# Altium footprint library SMT.PcbLib: 379 footprints (part 3 of 24)
Each footprint in its own frame and in the unit in brackets; x right, y up, seen from the top. Pads: shape width x height; smd on the part's side, far side on the other; paste and mask are expansions set on the pad; w line width, h text height; cw(c..) or ccw(c..) is an arc to the next point about the centre after c.
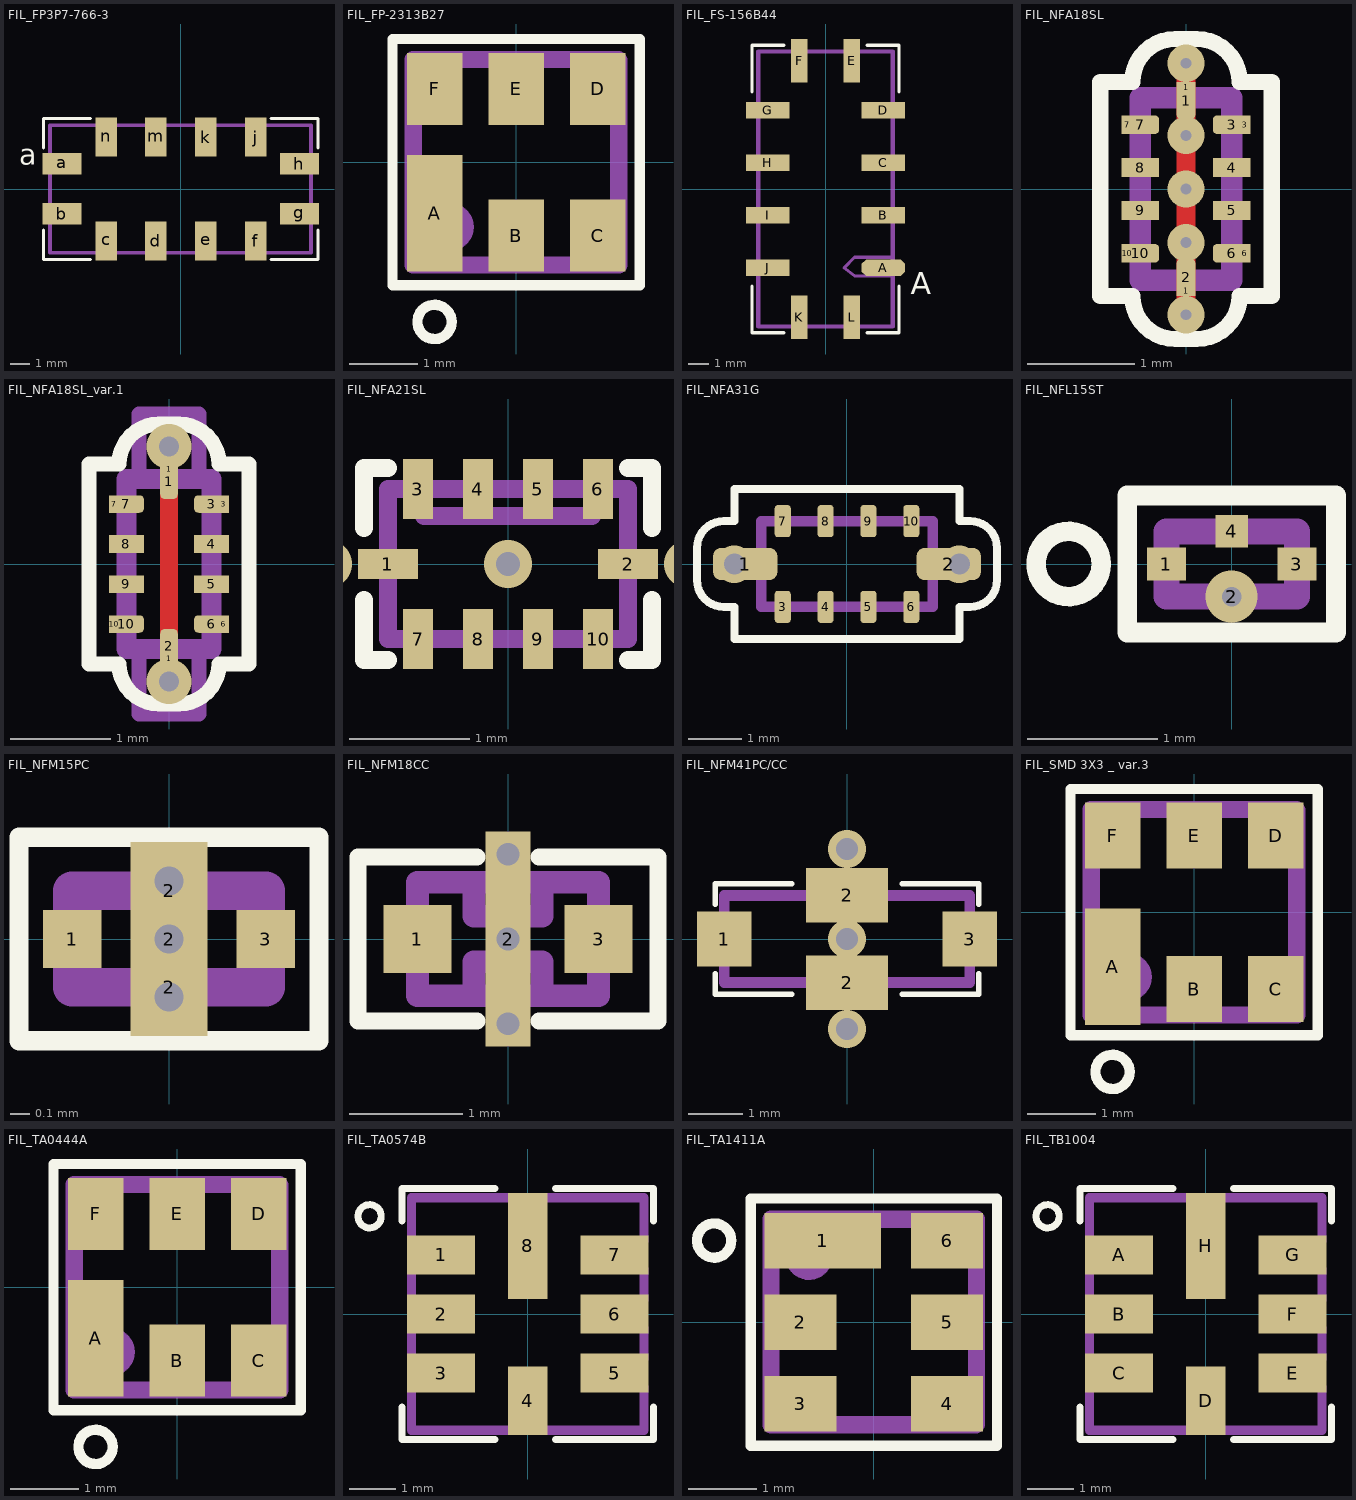
[diagram p2: the footprints below, top view; thin cyan lines are the x and y axes]

## FIL_FP3P7-766-3 [mm] "Фильтр пьезозлектрическии 13,3X6.5X2"
height 2
pads (12):
  rect 2x1.1 smd: a(-6.06,1.28) b(-6.06,-1.26) g(6.04,-1.26) h(6.04,1.28)
  rect 1.1x2 smd: c(-3.81,-2.65) d(-1.27,-2.65) e(1.27,-2.65) f(3.81,-2.65) j(3.81,2.65) k(1.27,2.65) m(-1.27,2.65) n(-3.81,2.65)
Top Overlay:
  lines w0.15: -7,-2.1 -7,-3.6 -4.6,-3.6 ; -7,2.1 -7,3.6 -4.6,3.6 ; 4.6,-3.6 7,-3.6 7,-2.1 ; 4.6,3.6 7,3.6 7,2.1
  text "a" at -8.25,0.87 h1.8
Mechanical 1:
  circle w0.2: c-5.625,1.27 r0.25
  lines w0.2: -6.66,-3.25 -6.66,-1.67 ccw(c-6.66,-1.27) -6.66,-0.87 -6.66,0.87 ccw(c-6.66,1.27) -6.66,1.67 -6.66,3.25 -4.22,3.25 ccw(c-3.82,3.25) -3.42,3.25 -1.68,3.25 ccw(c-1.28,3.25) -0.88,3.25 0.86,3.25 ccw(c1.26,3.25) 1.66,3.25 3.4,3.25 ccw(c3.8,3.25) 4.2,3.25 6.64,3.25 6.64,1.67 ccw(c6.64,1.27) 6.64,0.87 6.64,-0.87 ccw(c6.64,-1.27) 6.64,-1.67 6.64,-3.25 4.2,-3.25 ccw(c3.8,-3.25) 3.4,-3.25 1.66,-3.25 ccw(c1.26,-3.25) 0.86,-3.25 -0.88,-3.25 ccw(c-1.28,-3.25) -1.68,-3.25 -3.42,-3.25 ccw(c-3.82,-3.25) -4.22,-3.25 -6.66,-3.25
3D body "ФП3П7-766-3-01.stp": height 2.01, standoff 0.01, extent -6.65,-3.25 6.65,3.25

## FIL_FP-2313B27 [mm] "SMD 3,0x3,0"
height 1.4
pads (6):
  rect 0.81x1.7 smd: A(-1.19,-0.745)
  rect 0.81x1.05 smd: B(0,-1.07) C(1.19,-1.07) D(1.19,1.07) E(0,1.07) F(-1.19,1.07)
Top Overlay:
  circle w0.15: c-1.19,-2.33 r0.25
  lines w0.15: -1.805,-1.795 -1.805,1.8 1.805,1.8 1.805,-1.795 -1.805,-1.795
Mechanical 1:
  circle w0.2: c-0.965,-0.945 r0.25
  lines w0.254: -1.5,-1.5 -1.5,1.5 1.49,1.5 1.5,1.49 1.5,-1.5 -1.5,-1.5
3D body "SMD_3,0Х3,0.STEP": height 1.37, standoff 0, extent -1.495,-1.5 1.505,1.5

## FIL_FS-156B44 [mm] "Бутис_FS-156B44"
height 1.8
pads (12):
  oct 2.1x0.8 smd: A(2.8,-3.81)
  rect 2.1x0.8 smd: B(2.8,-1.27) C(2.8,1.27) D(2.8,3.81) G(-2.8,3.81) H(-2.8,1.27) I(-2.8,-1.27) J(-2.8,-3.81)
  rect 0.8x2.1 smd: E(1.27,6.2) F(-1.27,6.2) K(-1.27,-6.2) L(1.27,-6.2)
Top Overlay:
  lines w0.15: -3.55,-4.7 -3.55,-6.95 -2,-6.95 ; -3.55,4.7 -3.55,6.95 -2,6.95 ; 2,-6.95 3.55,-6.95 3.55,-4.7 ; 2,6.95 3.55,6.95 3.55,4.7
  text "A" at 4.125,-5.45 h1.8
Mechanical 1:
  lines w0.15: 3.25,-4.2 1.4,-4.2 0.9,-3.81 1.4,-3.3 3.25,-3.3
  lines w0.2: -3.25,-6.65 3.25,-6.65 3.25,6.65 -3.25,6.65 -3.25,-6.65
3D body "FS-156B44.stp": height 1.8, standoff 0, extent -3.25,-6.65 3.25,6.65

## FIL_NFA18SL [mm] "Chip Array, Flat, 8-Leads, Pitch 0,40mm,  Body 1,60x0,80mm,  IPC Medium Density"
height 0.65
pads (16):
  rect 0.175x0.1 smd mask+0.05: 1(0,-0.95) 1(0,0.95)
  rrect50% 0.175x0.35 smd mask+0.05: 1(0,0.825) 2(0,-0.825)
  rrect50% 0.35x0.175 smd paste+0.015 mask+0.05: 3(0.425,0.6) 6(0.425,-0.6) 7(-0.425,0.6) 10(-0.425,-0.6)
  rect 0.1x0.175 smd paste+0.015 mask+0.05: 3(0.55,0.6) 6(0.55,-0.6) 7(-0.55,0.6) 10(-0.55,-0.6)
  rect 0.35x0.175 smd paste+0.015 mask+0.05: 4(0.425,0.2) 5(0.425,-0.2) 8(-0.425,0.2) 9(-0.425,-0.2)
via 0,-0.5 diameter 0.35 hole 0.1
via 0,0.5 diameter 0.35 hole 0.1
via 0,0 diameter 0.35 hole 0.1
via 0,1.175 diameter 0.35 hole 0.1
via 0,-1.175 diameter 0.35 hole 0.1
Top Layer:
  lines w0.175: 0,-1.175 0,-0.825 0,0.825 ; 0,1.175 0,0.85 ; 0,0.85 0,0.85
Top Overlay:
  lines w0.15: -0.8,-1 -0.8,1 -0.5,1 cw(c-0.1,1) -0.1,1.4 0.1,1.4 cw(c0.1,1) 0.5,1 0.8,1 0.8,-1 0.5,-1 cw(c0.1,-1) 0.1,-1.4 -0.1,-1.4 cw(c-0.1,-1) -0.5,-1 -0.8,-1
Mechanical 1:
  lines w0.2: -0.425,-0.85 0.425,-0.85 0.425,0.85 -0.425,0.85 -0.425,-0.85
Mechanical 20:
  text "Отв. 0,1  / заполнить" at -1.725,1.475 h1
3D body "CAF-40P159X79-8N.step": height 0.65, standoff 0, extent -0.5,-0.85 0.5,0.85

## FIL_NFA18SL_var.1 [mm] "Chip Array, Flat, 8-Leads, Pitch 0,40mm,  Body 1,60x0,80mm,  установка не по datasheet"
height 0.65
pads (16):
  rect 0.175x0.1 smd mask+0.05: 1(0,-0.95) 1(0,0.95)
  rrect50% 0.175x0.35 smd mask+0.05: 1(0,0.825) 2(0,-0.825)
  rrect50% 0.35x0.175 smd paste+0.015 mask+0.05: 3(0.425,0.6) 6(0.425,-0.6) 7(-0.425,0.6) 10(-0.425,-0.6)
  rect 0.1x0.175 smd paste+0.015 mask+0.05: 3(0.55,0.6) 6(0.55,-0.6) 7(-0.55,0.6) 10(-0.55,-0.6)
  rect 0.35x0.175 smd paste+0.015 mask+0.05: 4(0.425,0.2) 5(0.425,-0.2) 8(-0.425,0.2) 9(-0.425,-0.2)
via 0,-1.175 diameter 0.45 hole 0.2
via 0,1.175 diameter 0.45 hole 0.2
Top Layer:
  lines w0.175: 0,-1.175 0,-0.825 0,0.825 ; 0,1.175 0,0.85 ; 0,0.85 0,0.85
Top Overlay:
  lines w0.15: -0.8,-1 -0.8,1 -0.5,1 cw(c-0.1,1) -0.1,1.4 0.1,1.4 cw(c0.1,1) 0.5,1 0.8,1 0.8,-1 0.5,-1 cw(c0.1,-1) 0.1,-1.4 -0.1,-1.4 cw(c-0.1,-1) -0.5,-1 -0.8,-1
Mechanical 1:
  lines w0.2: -0.425,-0.85 0.425,-0.85 0.425,0.85 -0.425,0.85 -0.425,-0.85
Mechanical 5:
  lines w0.15: -0.3,-1.5 0.3,-1.5 0.3,-0.85 -0.3,-0.85 -0.3,-1.5 ; -0.3,0.85 -0.3,1.5 0.3,1.5 0.3,0.85 -0.3,0.85
Mechanical 20:
  text "Отв. 0,2  / заполнить" at -1.725,1.475 h1
3D body "CAF-40P159X79-8N.step": height 0.65, standoff 0, extent -0.5,-0.85 0.5,0.85

## FIL_NFA21SL [mm] "Chip filter,  2-Leads, Body 2.0x1.25mm, IPC Medium Density"
height 0.5
pads (10):
  rect 0.5x0.25 smd mask+0.05: 1(-1,0) 2(1,0)
  rect 0.25x0.5 smd mask+0.05: 3(-0.75,0.625) 4(-0.25,0.625) 5(0.25,0.625) 6(0.75,0.625) 7(-0.75,-0.625) 8(-0.25,-0.625) 9(0.25,-0.625) 10(0.75,-0.625)
via 0,0 diameter 0.4 hole 0.2
via 1.5,0 diameter 0.4 hole 0.2
via -1.5,0 diameter 0.4 hole 0.2
Top Overlay:
  lines w0.15: -1.2,-0.3 -1.2,-0.8 -1,-0.8 ; -1.2,0.3 -1.2,0.8 -1,0.8 ; 1,-0.8 1.2,-0.8 1.2,-0.3 ; 1,0.8 1.2,0.8 1.2,0.3
Mechanical 1:
  lines w0.15: -0.7,0.4 0.7,0.4 ; -1,-0.625 1,-0.625 1,0.625 -1,0.625 -1,-0.625
3D body "NFA21.stp": height 0.51, standoff -0.01, extent -1,-0.625 1,0.625

## FIL_NFA31G [mm] "SMT filter NFA31G Series (1206 Size)"
height 1
pads (10):
  rrect50% 1.2x0.6 smd paste-10 mask+0.05: 1(-1.9,0) 2(1.9,0)
  rrect40% 0.3x0.6 smd paste+0 mask+0.05: 3(-1.2,-0.8) 4(-0.4,-0.8) 5(0.4,-0.8) 6(1.2,-0.8) 7(-1.2,0.8) 8(-0.4,0.8) 9(0.4,0.8) 10(1.2,0.8)
via 2.1,0 diameter 0.7 hole 0.4
via -2.1,0 diameter 0.7 hole 0.4
Top Overlay:
  lines w0.15: -2.8,-0.3 ccw(c-2.3,-0.3) -2.3,-0.8 -2.1,-0.8 -2.1,-1.4 2.1,-1.4 2.1,-0.8 2.3,-0.8 ccw(c2.3,-0.3) 2.8,-0.3 2.8,0.3 ccw(c2.3,0.3) 2.3,0.8 2.1,0.8 2.1,1.4 -2.1,1.4 -2.1,0.8 -2.3,0.8 ccw(c-2.3,0.3) -2.8,0.3 -2.8,-0.3
Top Paste:
  region: 1.45,0.3 1.42,0.3 1.365,0.277 1.323,0.235 1.3,0.18 1.3,0.15 1.3,-0.15 1.3,-0.18 1.323,-0.235 1.365,-0.277 1.42,-0.3 1.45,-0.3 1.75,-0.3 1.78,-0.3 1.835,-0.277 1.877,-0.235 1.9,-0.18 1.9,-0.15 1.9,0.15 1.9,0.18 1.877,0.235 1.835,0.277 1.78,0.3 1.75,0.3
  region: -1.45,0.3 -1.42,0.3 -1.365,0.277 -1.323,0.235 -1.3,0.18 -1.3,0.15 -1.3,-0.15 -1.3,-0.18 -1.323,-0.235 -1.365,-0.277 -1.42,-0.3 -1.45,-0.3 -1.75,-0.3 -1.78,-0.3 -1.835,-0.277 -1.877,-0.235 -1.9,-0.18 -1.9,-0.15 -1.9,0.15 -1.9,0.18 -1.877,0.235 -1.835,0.277 -1.78,0.3 -1.75,0.3
Top Solder:
  region: 1.85,0.35 1.86,0.35 1.878,0.342 1.892,0.328 1.9,0.31 1.9,0.3 1.9,-0.3 1.9,-0.31 1.892,-0.328 1.878,-0.342 1.86,-0.35 1.85,-0.35 1.3,-0.35 1.29,-0.35 1.272,-0.342 1.258,-0.328 1.25,-0.31 1.25,-0.3 1.25,0.3 1.25,0.31 1.258,0.328 1.272,0.342 1.29,0.35 1.3,0.35
  region: -1.85,0.35 -1.86,0.35 -1.878,0.342 -1.892,0.328 -1.9,0.31 -1.9,0.3 -1.9,-0.3 -1.9,-0.31 -1.892,-0.328 -1.878,-0.342 -1.86,-0.35 -1.85,-0.35 -1.3,-0.35 -1.29,-0.35 -1.272,-0.342 -1.258,-0.328 -1.25,-0.31 -1.25,-0.3 -1.25,0.3 -1.25,0.31 -1.258,0.328 -1.272,0.342 -1.29,0.35 -1.3,0.35
Mechanical 1:
  lines w0.2: -1.7,0 -1.6,0 ; -1.2,-0.9 -1.2,-0.8 ; -1.2,0.8 -1.2,0.9 ; -0.4,-0.9 -0.4,-0.8 ; -0.4,0.8 -0.4,0.9 ; 0.4,-0.9 0.4,-0.8 ; 0.4,0.8 0.4,0.9 ; 1.2,-0.9 1.2,-0.8 ; 1.2,0.8 1.2,0.9 ; 1.6,0 1.7,0 ; -1.6,-0.8 -1.6,0.8 1.6,0.8 1.6,-0.8 -1.6,-0.8
3D body "User Library-EMIFIL.STEP": height 0.81, standoff 0.01, extent -1.6,-0.8 1.6,0.8

## FIL_NFL15ST [mm] "Chip Filter, 4-Leads, Body 1,00x0,50mm, IPC Medium Density"
height 0.35
pads (4):
  rect 0.3x0.25 smd paste+0 mask+0.05: 1(-0.5,0) 3(0.5,0)
  rect 0.25x0.25 smd paste+0 mask+0.05: 2(0,-0.25) 4(0,0.25)
via 0,-0.25 diameter 0.4 hole 0.15
Top Overlay:
  circle w0.15: c-1.25,0 r0.25
  lines w0.15: -0.8,-0.525 0.8,-0.525 0.8,0.525 -0.8,0.525 -0.8,-0.525
Mechanical 1:
  lines w0.2: -0.5,-0.25 0.5,-0.25 0.5,0.25 -0.5,0.25 -0.5,-0.25
Mechanical 20:
  text "Отверстия  / заполнить" at -3.35,0.7 h1.5
3D body "FIL_NFL15ST.step": height 0.35, standoff 0, extent -0.5,-0.25 0.5,0.25

## FIL_NFM15PC [mm] "Chip Capacitor, 2-Leads, Body 1,00x0,50mm, IPC Medium Density"
height 0.5
pads (5):
  rect 0.3x0.3 smd paste+0 mask+0.05: 1(-0.5,0) 3(0.5,0)
  rect 0.25x0.25 smd paste+0 mask+0.05: 2(0,-0.25) 2(0,0.25)
  rect 0.4x1 smd paste-10: 2(0,0)
via 0,0 diameter 0.4 hole 0.15
via 0,-0.3 diameter 0.4 hole 0.15
via 0,0.3 diameter 0.4 hole 0.15
Top Overlay:
  lines w0.1: -0.775,-0.525 -0.775,0.525 0.775,0.525 0.775,-0.525 -0.775,-0.525
Mechanical 1:
  lines w0.2: -0.5,-0.25 -0.5,0.25 0.5,0.25 0.5,-0.25 -0.5,-0.25
Mechanical 20:
  text "Отверстия  / заполнить" at -3.3,0.925 h1.5
3D body "CAPC1005X05N.step": height 0.5, standoff 0, extent -0.55,-0.35 0.55,0.35

## FIL_NFM18CC [mm] "0603 size general 3-terminal capacitor."
height 0.6
pads (3):
  rect 0.6x0.6 smd paste+0 mask+0.1: 1(-0.8,0) 3(0.8,0)
  rect 0.4x1.9 smd paste-20: 2(0,0)
via 0,0 diameter 0.4 hole 0.2
via 0,0.75 diameter 0.4 hole 0.2
via 0,-0.75 diameter 0.4 hole 0.2
Top Overlay:
  lines w0.15: -0.275,-0.725 -1.325,-0.725 -1.325,0.725 -0.275,0.725 ; 0.275,-0.725 1.325,-0.725 1.325,0.725 0.275,0.725
Top Paste:
  rectangle: -0.2,-0.6 0.2,-0.2
  rectangle: -0.2,0.2 0.2,0.6
Top Solder:
  rectangle: -0.25,-0.6 0.25,-0.2
  rectangle: -0.25,0.2 0.25,0.6
Mechanical 1:
  lines w0.2: -0.3,-0.5 -0.3,-0.2 0.3,-0.2 0.3,-0.5 ; -0.3,0.5 -0.3,0.2 0.3,0.2 0.3,0.5 ; -0.8,-0.5 -0.8,0.5 0.8,0.5 0.8,-0.5 -0.8,-0.5
3D body "User Library-EMIFIL_0603.STEP": height 0.6, standoff 0, extent -0.8,-0.409 0.8,0.409

## FIL_NFM41PC/CC [mm] "Chip filter,  2-Leads, Body 4.5x1.6mm, IPC Medium Density"
height 1
pads (4):
  rect 1x1 smd paste+0 mask+0.05: 1(-2.25,0) 3(2.25,0)
  rect 1.5x1 smd paste+0 mask+0.05: 2(0,-0.8) 2(0,0.8)
via 0,0 diameter 0.7 hole 0.4
via 0,1.651 diameter 0.7 hole 0.4
via 0,-1.651 diameter 0.7 hole 0.4
Top Overlay:
  lines w0.1: -2.413,-0.635 -2.413,-1.016 -1.016,-1.016 ; -2.413,0.635 -2.413,1.016 -1.016,1.016 ; 1.016,-1.016 2.413,-1.016 2.413,-0.635 ; 1.016,1.016 2.413,1.016 2.413,0.635
Mechanical 1:
  lines w0.2: -2.25,-0.8 -2.25,0.8 2.25,0.8 2.25,-0.8 -2.25,-0.8
3D body "NFM41PC.stp": height 1.01, standoff -0.01, extent -2.25,-0.8 2.25,0.8

## FIL_SMD 3X3 _ var.3 [mm] "SMD 3,0x3,0"
height 1.4
pads (6):
  rect 0.81x1.7 smd: A(-1.19,-0.795)
  rect 0.81x0.96 smd: B(0,-1.12) C(1.19,-1.12) D(1.19,1.12) E(0,1.12) F(-1.19,1.12)
Top Overlay:
  circle w0.15: c-1.19,-2.33 r0.25
  lines w0.15: -1.805,-1.795 -1.805,1.8 1.805,1.8 1.805,-1.795 -1.805,-1.795
Mechanical 1:
  circle w0.2: c-0.965,-0.945 r0.25
  lines w0.254: -1.5,-1.5 -1.5,1.5 1.49,1.5 1.5,1.49 1.5,-1.5 -1.5,-1.5
3D body "SMD_3,0Х3,0.STEP": height 1.37, standoff 0, extent -1.495,-1.5 1.505,1.5

## FIL_TA0444A [mm] "SMD 3,0x3,0"
height 1.4
pads (6):
  rect 0.81x1.7 smd: A(-1.19,-0.745)
  rect 0.81x1.05 smd: B(0,-1.07) C(1.19,-1.07) D(1.19,1.07) E(0,1.07) F(-1.19,1.07)
Top Overlay:
  circle w0.15: c-1.19,-2.33 r0.25
  lines w0.15: -1.805,-1.795 1.805,-1.795 1.805,1.8 -1.805,1.8 -1.805,-1.795
Mechanical 1:
  circle w0.2: c-0.965,-0.945 r0.25
  lines w0.254: -1.5,-1.5 1.5,-1.5 1.5,1.49 1.49,1.5 -1.5,1.5 -1.5,-1.5
3D body "SMD_3,0Х3,0.STEP": height 1.37, standoff 0, extent -1.495,-1.5 1.505,1.5

## FIL_TA0574B [mm] "SMD 5x5 mm"
height 1.7
pads (8):
  rect 1.47x0.84 smd: 1(-1.865,1.27) 2(-1.865,0) 3(-1.865,-1.27) 5(1.865,-1.27) 6(1.865,0) 7(1.865,1.27)
  rect 0.84x1.47 smd: 4(0,-1.863)
  rect 0.84x2.28 smd: 8(0,1.462)
Top Overlay:
  circle w0.15: c-3.4,2.1 r0.25
  lines w0.15: -2.7,-2 -2.7,-2.7 -0.7,-2.7 ; -2.7,2 -2.7,2.7 -0.7,2.7 ; 0.6,-2.7 2.7,-2.7 2.7,-2 ; 0.6,2.7 2.7,2.7 2.7,2
Mechanical 1:
  circle w0.2: c-1.5,1.25 r0.25
  lines w0.2: -2.5,-1.57 ccw(c-2.5,-1.27) -2.5,-0.97 -2.5,-0.3 ; -2.5,-1.57 -2.5,-1.57 ; -2.5,-1.57 -2.5,-2.5 -0.3,-2.5 cw(c0,-2.5) 0.3,-2.5 2.5,-2.5 ; -2.5,-0.3 ccw(c-2.5,0) -2.5,0.3 -2.5,0.97 ccw(c-2.5,1.27) -2.5,1.57 -2.5,2.5 ; -2.5,-0.3 -2.5,-0.3 ; -2.5,2.5 -0.3,2.5 ccw(c0,2.5) 0.3,2.5 2.5,2.5 2.5,1.57 ; -2.5,2.5 -2.5,2.5 ; 2.5,-2.5 2.5,-2.5 ; 2.5,-2.5 2.5,-1.57 cw(c2.5,-1.27) 2.5,-0.97 ; 2.5,-0.97 2.5,-0.97 ; 2.5,-0.97 2.5,-0.3 ; 2.5,-0.3 cw(c2.5,0) 2.5,0.3 ; 2.5,-0.3 cw(c2.5,0) 2.5,0.3 ; 2.5,0.3 2.5,0.3 ; 2.5,0.3 2.5,0.97 cw(c2.5,1.27) 2.5,1.57 ; 2.5,1.57 2.5,1.57
3D body "TA0574B.stp": height 1.7, standoff 0, extent -2.5,-2.5 2.5,2.5
3D body: height 0.25, standoff 0, extent 3.75,1.875 3.75,1.875

## FIL_TA1411A [mm] "SMD 3,0x3,0"
height 1.4
pads (6):
  rect 1.7x0.81 smd: 1(-0.745,1.195)
  rect 1.05x0.81 smd: 2(-1.07,0.005) 3(-1.07,-1.185) 4(1.07,-1.185) 5(1.07,0.005) 6(1.07,1.195)
Top Overlay:
  circle w0.15: c-2.33,1.195 r0.25
  lines w0.15: -1.795,-1.8 -1.795,1.81 1.8,1.81 1.8,-1.8 -1.795,-1.8
Mechanical 1:
  circle w0.2: c-0.945,0.97 r0.25
  lines w0.254: -1.5,-1.495 -1.5,1.505 1.5,1.505 1.5,-1.485 1.49,-1.495 -1.5,-1.495
3D body "SMD_3,0Х3,0.STEP": height 1.37, standoff 0, extent -1.5,-1.5 1.5,1.5

## FIL_TB1004 [mm] "SMD 5x5 mm"
height 1.7
pads (8):
  rect 1.47x0.84 smd: A(-1.865,1.27) B(-1.865,0) C(-1.865,-1.27) E(1.865,-1.27) F(1.865,0) G(1.865,1.27)
  rect 0.84x1.47 smd: D(0,-1.863)
  rect 0.84x2.28 smd: H(0,1.462)
Top Overlay:
  circle w0.15: c-3.4,2.1 r0.25
  lines w0.15: -2.7,-2 -2.7,-2.7 -0.7,-2.7 ; -2.7,2 -2.7,2.7 -0.7,2.7 ; 0.6,-2.7 2.7,-2.7 2.7,-2 ; 0.6,2.7 2.7,2.7 2.7,2
Mechanical 1:
  circle w0.2: c-1.5,1.25 r0.25
  lines w0.2: -2.5,-1.57 ccw(c-2.5,-1.27) -2.5,-0.97 -2.5,-0.3 ; -2.5,-1.57 -2.5,-1.57 ; -2.5,-1.57 -2.5,-2.5 -0.3,-2.5 cw(c0,-2.5) 0.3,-2.5 2.5,-2.5 ; -2.5,-0.3 ccw(c-2.5,0) -2.5,0.3 -2.5,0.97 ccw(c-2.5,1.27) -2.5,1.57 -2.5,2.5 ; -2.5,-0.3 -2.5,-0.3 ; -2.5,2.5 -0.3,2.5 ccw(c0,2.5) 0.3,2.5 2.5,2.5 2.5,1.57 ; -2.5,2.5 -2.5,2.5 ; 2.5,-2.5 2.5,-2.5 ; 2.5,-2.5 2.5,-1.57 cw(c2.5,-1.27) 2.5,-0.97 ; 2.5,-0.97 2.5,-0.97 ; 2.5,-0.97 2.5,-0.3 ; 2.5,-0.3 cw(c2.5,0) 2.5,0.3 ; 2.5,-0.3 cw(c2.5,0) 2.5,0.3 ; 2.5,0.3 2.5,0.3 ; 2.5,0.3 2.5,0.97 cw(c2.5,1.27) 2.5,1.57 ; 2.5,1.57 2.5,1.57
3D body "TA0574B.stp": height 1.7, standoff 0, extent -2.5,-2.5 2.5,2.5